# Altium footprint library PCB_Library.PcbLib: 110 footprints (part 5 of 7)
Each footprint in its own frame and in the unit in brackets; x right, y up, seen from the top. Pads: shape width x height; smd on the part's side, far side on the other; paste and mask are expansions set on the pad; w line width, h text height; cw(c..) or ccw(c..) is an arc to the next point about the centre after c.
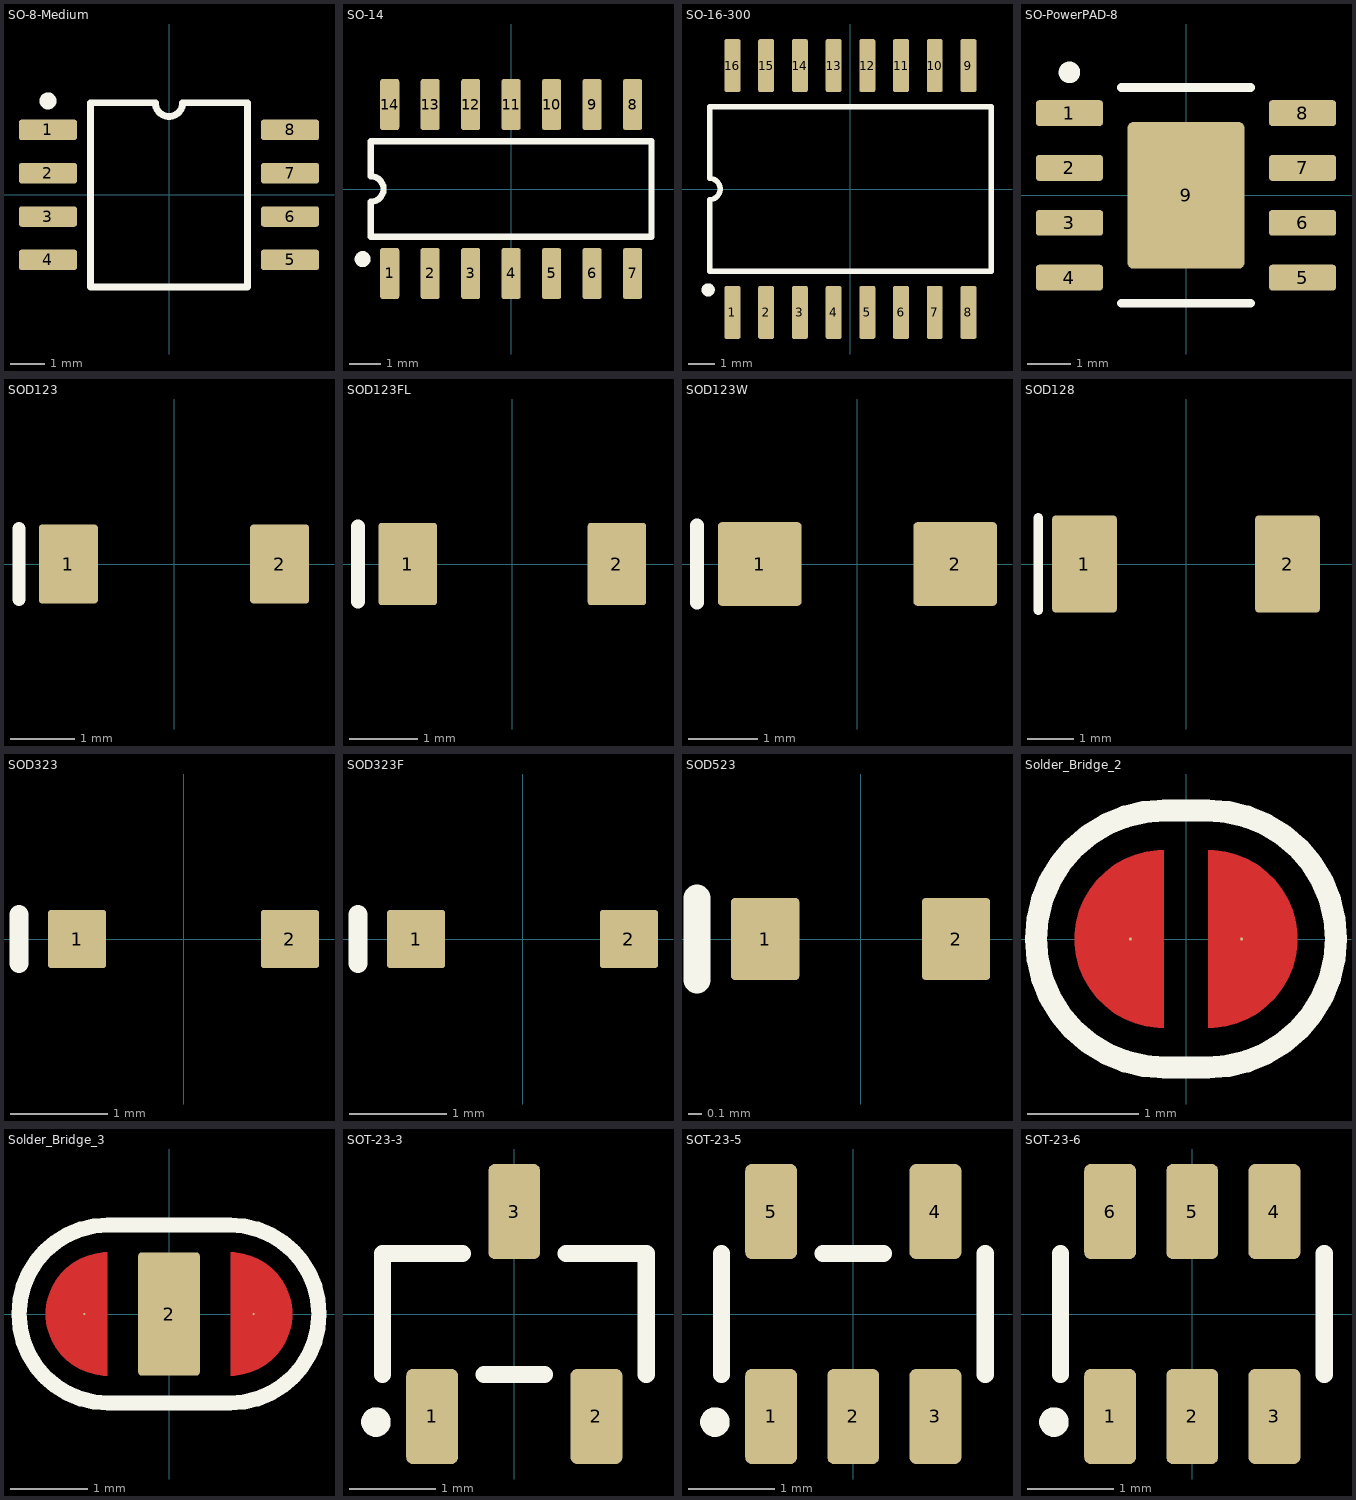
[diagram p4: the footprints below, top view; thin cyan lines are the x and y axes]

## SO-8-Medium [mm]
height 2.16
pads (8):
  rrect25% 1.7x0.6 smd paste-0.05 mask+0.05: 1(-3.55,1.905) 2(-3.55,0.635) 3(-3.55,-0.635) 4(-3.55,-1.905) 5(3.55,-1.905) 6(3.55,-0.635) 7(3.55,0.635) 8(3.55,1.905)
Top Overlay:
  circle w0.25: c-3.55,2.755 r0.125
  lines w0.2: -2.3,-2.7 2.3,-2.7 2.3,2.7 0.4,2.7 cw(c0,2.7) -0.4,2.7 -2.3,2.7 -2.3,-2.7
3D body "SO8 Medium 5.28mm.step": height 2.03, standoff 0, extent -4.13,-2.665 4.13,2.665

## SO-14 [mm]
pads (14):
  rrect25% 0.6x1.6 smd paste-0.05 mask+0.075: 1(-3.81,-2.65) 2(-2.54,-2.65) 3(-1.27,-2.65) 4(0,-2.65) 5(1.27,-2.65) 6(2.54,-2.65) 7(3.81,-2.65) 8(3.81,2.65) 9(2.54,2.65) 10(1.27,2.65) 11(0,2.65) 12(-1.27,2.65) 13(-2.54,2.65) 14(-3.81,2.65)
Top Overlay:
  circle w0.25: c-4.66,-2.2 r0.125
  lines w0.2: -4.405,-1.2 -4.405,-1.5 ; -4.405,1.2 -4.405,1.5 ; -4.405,-1.5 -4.405,-0.4 ccw(c-4.405,0) -4.405,0.4 -4.405,1.5 ; -4.405,-1.5 4.405,-1.5 4.405,1.5 -4.405,1.5
3D body "so14.step": height 1.75, standoff 0, extent -4.4,-3 4.4,3

## SO-16-300 [mm] "Wide SOIC-16"
pads (16):
  rrect25% 0.6x2 smd paste-0.05 mask+0.075: 1(-4.445,-4.65) 2(-3.175,-4.65) 3(-1.905,-4.65) 4(-0.635,-4.65) 5(0.635,-4.65) 6(1.905,-4.65) 7(3.175,-4.65) 8(4.445,-4.65) 9(4.445,4.65) 10(3.175,4.65) 11(1.905,4.65) 12(0.635,4.65) 13(-0.635,4.65) 14(-1.905,4.65) 15(-3.175,4.65) 16(-4.445,4.65)
Top Overlay:
  circle w0.25: c-5.36,-3.8 r0.125
  lines w0.2: -5.305,-3.1 -5.305,-0.4 ccw(c-5.305,0) -5.305,0.4 -5.305,3.1 5.305,3.1 5.305,-3.1 -5.305,-3.1
3D body "SOIC16WIDE.step": height 2.6, standoff 0, extent -5.25,-5.162 5.25,5.163

## SO-PowerPAD-8 [mm]
pads (9):
  rrect25% 1.55x0.6 smd paste-0.045 mask+0.07: 1(-2.7,1.905) 2(-2.7,0.635) 3(-2.7,-0.635) 4(-2.7,-1.905) 5(2.7,-1.905) 6(2.7,-0.635) 7(2.7,0.635) 8(2.7,1.905)
  rrect10% 2.71x3.4 smd paste-0.2 mask+0.07: 9(0,0)
Top Overlay:
  circle w0.25: c-2.7,2.85 r0.125
  lines w0.2: -1.5,-2.5 1.5,-2.5 ; -1.5,2.5 1.5,2.5
3D body "IC_Texas_Instruments_TPS54360BQDDARQ1_eec.STEP": height 1.7, standoff 0, extent -3,-2.45 3,2.45

## SOD123 [mm]
pads (2):
  rrect10% 0.91x1.22 smd paste-0.05 mask+0.05: 1(-1.635,0) 2(1.635,0)
Top Overlay:
  lines w0.2: -2.4,-0.55 -2.4,0.55
3D body "User Library-SOD3716X14.step": height 1.35, standoff 0, extent -1.85,-0.775 1.85,0.775

## SOD123FL [mm]
pads (2):
  rrect10% 0.85x1.2 smd paste-0.05 mask+0.05: 1(-1.525,0) 2(1.525,0)
Top Overlay:
  lines w0.2: -2.25,-0.55 -2.25,0.55
3D body "User Library-SOD-123FL CASE 498.step": height 0.95, standoff 0, extent -1.8,-0.825 1.8,0.825

## SOD123W [mm]
pads (2):
  rrect10% 1.2x1.2 smd paste-0.06 mask+0.05: 1(-1.4,0) 2(1.4,0)
Top Overlay:
  lines w0.2: -2.3,-0.55 -2.3,0.55
3D body "User Library-SOD123W-1.step": height 1.1, standoff -0.01, extent -1.85,-0.95 1.85,0.95

## SOD128 [mm]
pads (2):
  rrect10% 1.4x2.1 smd paste-0.1 mask+0.05: 1(-2.2,0) 2(2.2,0)
Top Overlay:
  lines w0.2: -3.2,-1 -3.2,1
3D body "User Library-SOD-128Flat.step": height 1.02, standoff 0, extent -2.4,-1.25 2.4,1.25

## SOD323 [mm]
pads (2):
  rrect10% 0.6x0.6 smd paste-0.03 mask+0.05: 1(-1.1,0) 2(1.1,0)
Top Overlay:
  lines w0.2: -1.7,-0.25 -1.7,0.25
3D body "User Library-SOD323.step": height 0.98, standoff -0.01, extent -1.25,-0.625 1.25,0.625

## SOD323F [mm]
pads (2):
  rrect10% 0.6x0.6 smd paste-0.03 mask+0.05: 1(-1.1,0) 2(1.1,0)
Top Overlay:
  lines w0.2: -1.7,-0.25 -1.7,0.25
3D body "User Library-SOD323F-1.step": height 1, standoff 0, extent -1.25,-0.675 1.25,0.675

## SOD523 [mm]
pads (2):
  rrect10% 0.5x0.6 smd mask+0.05: 1(-0.7,0) 2(0.7,0)
Top Overlay:
  lines w0.2: -1.2,-0.3 -1.2,0.3
3D body "User Library-SOD523-2.step": height 0.65, standoff 0, extent -0.825,-0.4 0.825,0.4

## Solder_Bridge_2 [mil]
pads (2):
  round 1 smd paste-1.97 mask+1.97: 1(-19.68,0) 2(19.68,0)
Top Layer:
  region: -7.87,31.5 -9.94,31.5 -14.03,30.96 -18.02,29.89 -21.83,28.31 -25.41,26.24 -28.69,23.73 -31.6,20.81 -34.12,17.54 -36.18,13.96 -37.76,10.15 -38.83,6.16 -39.37,2.06 -39.37,0 -39.37,-2.06 -38.83,-6.16 -37.76,-10.15 -36.18,-13.96 -34.12,-17.54 -31.6,-20.81 -28.69,-23.73 -25.41,-26.24 -21.83,-28.31 -18.02,-29.89 -14.03,-30.96 -9.94,-31.5 -7.87,-31.5
  region: 7.87,-31.5 9.94,-31.5 14.03,-30.96 18.02,-29.89 21.83,-28.31 25.41,-26.24 28.69,-23.73 31.6,-20.81 34.12,-17.54 36.18,-13.96 37.76,-10.15 38.83,-6.16 39.37,-2.06 39.37,0 39.37,2.06 38.83,6.16 37.76,10.15 36.18,13.96 34.12,17.54 31.6,20.81 28.69,23.73 25.41,26.24 21.83,28.31 18.02,29.89 14.03,30.96 9.94,31.5 7.87,31.5
Top Overlay:
  lines w7.87: -7.57,-45.58 cw(c-7.57,0) -7.57,45.58 7.57,45.58 cw(c7.57,0) 7.57,-45.58 -7.57,-45.58
Top Solder:
  rectangle: -7.87,-33.46 7.87,33.46

## Solder_Bridge_3 [mm]
pads (3):
  round 0.025 smd paste-0.05 mask+0.05: 1(-1.1,0) 3(1.1,0)
  rrect10% 0.8x1.6 smd paste-0.05 mask+0.05: 2(0,0)
Top Layer:
  region: 0.8,-0.8 0.852,-0.8 0.956,-0.786 1.058,-0.759 1.155,-0.719 1.245,-0.667 1.329,-0.603 1.403,-0.529 1.467,-0.445 1.519,-0.355 1.559,-0.258 1.586,-0.156 1.6,-0.052 1.6,0 1.6,0.052 1.586,0.156 1.559,0.258 1.519,0.355 1.467,0.445 1.403,0.529 1.329,0.603 1.245,0.667 1.155,0.719 1.058,0.759 0.956,0.786 0.852,0.8 0.8,0.8
  region: -0.8,0.8 -0.852,0.8 -0.956,0.786 -1.058,0.759 -1.155,0.719 -1.245,0.667 -1.329,0.603 -1.403,0.529 -1.467,0.445 -1.519,0.355 -1.559,0.258 -1.586,0.156 -1.6,0.052 -1.6,0 -1.6,-0.052 -1.586,-0.156 -1.559,-0.258 -1.519,-0.355 -1.467,-0.445 -1.403,-0.529 -1.329,-0.603 -1.245,-0.667 -1.155,-0.719 -1.058,-0.759 -0.956,-0.786 -0.852,-0.8 -0.8,-0.8
Top Overlay:
  lines w0.2: -0.792,-1.158 cw(c-0.792,0) -0.792,1.158 0.792,1.158 cw(c0.792,0) 0.792,-1.158 -0.792,-1.158
Top Solder:
  rectangle: -0.8,-0.85 0.8,0.85

## SOT-23-3 [mm]
pads (3):
  rrect25% 0.6x1.1 smd paste-0.04 mask+0.05: 1(-0.95,-1.185) 2(0.95,-1.185) 3(0,1.185)
Top Overlay:
  circle w0.2: c-1.6,-1.25 r0.071
  lines w0.2: -1.525,-0.7 -1.525,0.7 -0.6,0.7 ; -0.35,-0.7 0.35,-0.7 ; 0.6,0.7 1.525,0.7 1.525,-0.7
3D body "SOT95P245X110-3N.step": height 1.1, standoff 0, extent -1.5,-1.3 1.5,1.3

## SOT-23-5 [mm]
pads (5):
  rrect25% 0.6x1.1 smd paste-0.04 mask+0.05: 1(-0.95,-1.185) 2(0,-1.185) 3(0.95,-1.185) 4(0.95,1.185) 5(-0.95,1.185)
Top Overlay:
  circle w0.2: c-1.6,-1.25 r0.071
  lines w0.2: -1.525,-0.7 -1.525,0.7 ; -0.35,0.7 0.35,0.7 ; 1.525,-0.7 1.525,0.7
3D body "SOT95P245X110-5N.step": height 1.1, standoff 0, extent -1.5,-1.3 1.5,1.3

## SOT-23-6 [mm]
pads (6):
  rrect25% 0.6x1.1 smd paste-0.04 mask+0.05: 1(-0.95,-1.185) 2(0,-1.185) 3(0.95,-1.185) 4(0.95,1.185) 5(0,1.185) 6(-0.95,1.185)
Top Overlay:
  circle w0.2: c-1.6,-1.25 r0.071
  lines w0.2: -1.525,-0.7 -1.525,0.7 ; 1.525,-0.7 1.525,0.7
3D body "x.step": height 1.1, standoff 0, extent -1.5,-1.3 1.5,1.3